# Altium footprint library PcbLib.PcbLib: 108 footprints (part 2 of 7)
Each footprint in its own frame and in the unit in brackets; x right, y up, seen from the top. Pads: shape width x height; smd on the part's side, far side on the other; paste and mask are expansions set on the pad; w line width, h text height; cw(c..) or ccw(c..) is an arc to the next point about the centre after c.
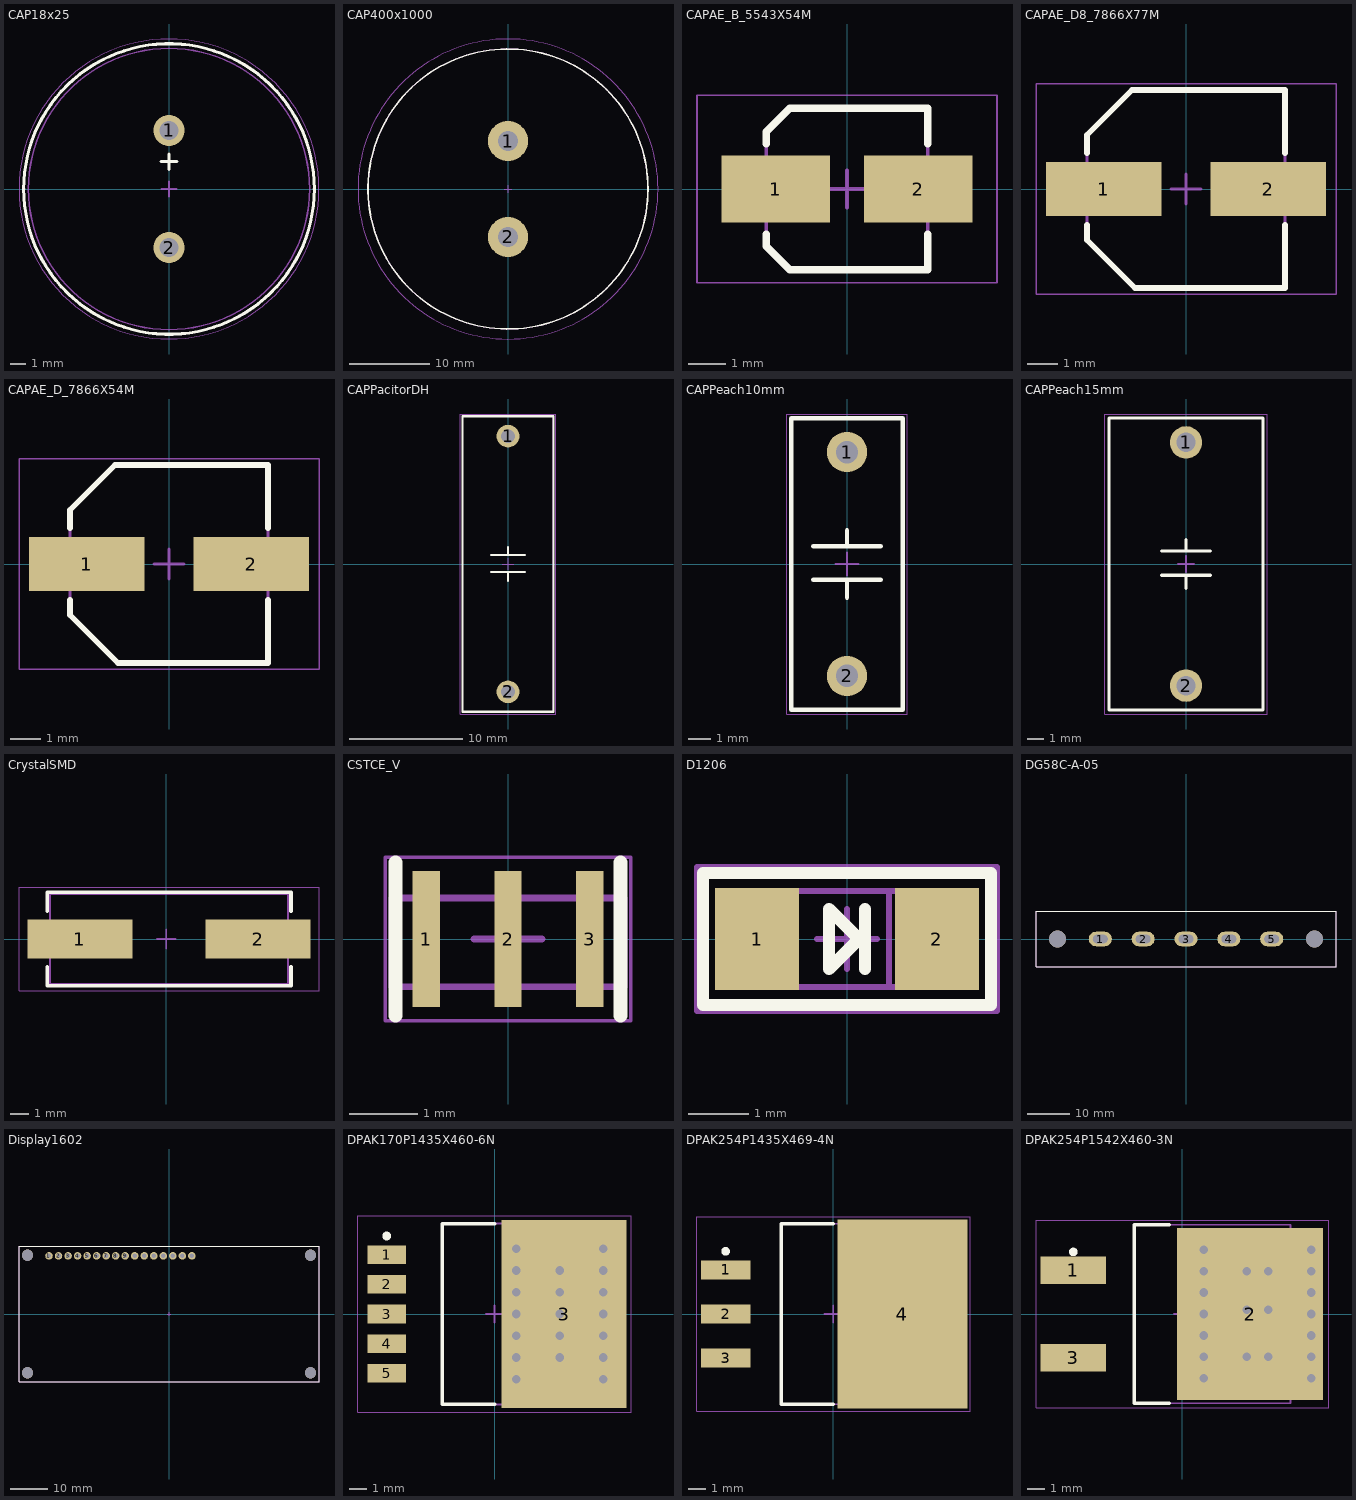
[diagram p1: the footprints below, top view; thin cyan lines are the x and y axes]

## CAP18x25 [mm]
height 25
pads (2):
  round 2 hole 1.2: 1(0,3.75) 2(0,-3.75)
Top Overlay:
  circle w0.2: c0,0 r9.3
  lines w0.2: -0.5,1.75 0.5,1.75 ; 0,1.25 0,2.25
Mechanical 13:
  circle w0.05: c0,0 r9.6
  lines w0.1: -0.5,0 0.5,0 ; 0,-0.5 0,0.5
Mechanical 14:
  circle w0.1: c0,0 r9
3D body "Capacitor18X25mm.step": height 25.55, standoff -3.1, extent -10.302,-10.346 10.295,10.297

## CAP400x1000 [mm]
height 60
pads (2):
  round 5 hole 2.5: 1(0,6) 2(0,-6)
Top Overlay:
  circle w0.2: c0,0 r17.5
Mechanical 13:
  circle w0.05: c0,0 r18.752
  lines w0.1: -0.5,0 0.5,0 ; 0,-0.5 0,0.5
Mechanical 14:
  circle w0.1: c0,0 r17.502
3D body "CAP400V1000uf.STEP": height 60, standoff -5.3, extent -24.549,-24.553 24.537,24.537

## CAPAE_B_5543X54M [mm] "Aluminum Electrolytic Capacitor, Body 4,30x4,30x5,40mm, IPC Low Density"
height 5.4
pads (2):
  rect 2.9x1.8 smd: 1(-1.9,0) 2(1.9,0)
Top Overlay:
  lines w0.2: -2.15,-1.2 -2.15,-1.525 -1.525,-2.15 2.15,-2.15 2.15,-1.2 ; -2.15,1.2 -2.15,1.525 -1.525,2.15 2.15,2.15 2.15,1.2
Mechanical 13:
  lines w0.05: -4,-2.5 -4,2.5 4,2.5 4,-2.5 -4,-2.5
  lines w0.1: -0.5,0 0.5,0 ; 0,-0.5 0,0.5
Mechanical 14:
  lines w0.1: -2.15,-1.525 -1.525,-2.15 2.15,-2.15 2.15,2.15 -1.525,2.15 -2.15,1.525 -2.15,-1.525
3D body "User Library-ALU-B.STEP": height 5.4, standoff 0, extent -2.3,-2.25 2.3,2.05

## CAPAE_D8_7866X77M [mm] "Aluminum Electrolytic Capacitor, Body 6,60x6,60x7.70mm, IPC Low Density"
height 7.7
pads (2):
  rect 3.85x1.8 smd: 1(-2.75,0) 2(2.75,0)
Top Overlay:
  lines w0.2: -3.3,-1.2 -3.3,-1.7 -1.7,-3.3 3.3,-3.3 3.3,-1.2 ; -3.3,1.2 -3.3,1.8 -1.8,3.3 3.3,3.3 3.3,1.2
Mechanical 13:
  lines w0.05: -5,-3.5 5,-3.5 5,3.5 -5,3.5 -5,-3.5
  lines w0.1: -0.5,0 0.5,0 ; 0,-0.5 0,0.5
Mechanical 14:
  lines w0.1: -3.3,-1.7 -3.3,1.8 -1.8,3.3 3.3,3.3 3.3,-3.3 -1.7,-3.3 -3.3,-1.7
3D body "User Library-ALU-D8.STEP": height 7.7, standoff 0, extent -3.5,-3.3 3.5,3.3

## CAPAE_D_7866X54M [mm] "Aluminum Electrolytic Capacitor, Body 6,60x6,60x5,40mm, IPC Low Density"
height 5.4
pads (2):
  rect 3.85x1.8 smd: 1(-2.75,0) 2(2.75,0)
Top Overlay:
  lines w0.2: -3.3,-1.2 -3.3,-1.7 -1.7,-3.3 3.3,-3.3 3.3,-1.2 ; -3.3,1.2 -3.3,1.8 -1.8,3.3 3.3,3.3 3.3,1.2
Mechanical 13:
  lines w0.05: -5,-3.5 -5,3.5 5,3.5 5,-3.5 -5,-3.5
  lines w0.1: -0.5,0 0.5,0 ; 0,-0.5 0,0.5
Mechanical 14:
  lines w0.1: -3.3,-1.7 -1.7,-3.3 3.3,-3.3 3.3,3.3 -1.8,3.3 -3.3,1.8 -3.3,-1.7
3D body "User Library-ALU-D.STEP": height 5.4, standoff 0, extent -3.5,-3.3 3.5,3.3

## CAPPacitorDH [mm] "Peach 22.5mm"
height 16
pads (2):
  round 2 hole 1.2: 1(0,11.25) 2(0,-11.25)
Top Overlay:
  lines w0.2: -1.5,-0.7 1.5,-0.7 ; -1.5,0.8 1.5,0.8 ; 0,-1.5 0,-0.7 ; 0,0.8 0,1.5 ; -4,-13 4,-13 4,13 -4,13 -4,3.5 -4,-13
Mechanical 13:
  lines w0.05: -4.2,-13.2 -4.2,13.2 4.2,13.2 4.2,-13.2 -4.2,-13.2
  lines w0.1: -0.5,0 0.5,0 ; 0,-0.5 0,0.5
Mechanical 14:
  lines w0.1: -4,-13 4,-13 4,13 -4,13 -4,-13
3D body "F844DH104M440C.step": height 16.1, standoff -4.9, extent -4.003,-13 4.003,13

## CAPPeach10mm [mm]
height 11
pads (2):
  round 1.8 hole 1: 1(0,5) 2(0,-5)
Top Overlay:
  lines w0.2: -1.5,-0.7 1.5,-0.7 ; -1.5,0.8 1.5,0.8 ; 0,-1.5 0,-0.7 ; 0,0.8 0,1.5 ; -2.5,-6.5 2.5,-6.5 2.5,6.5 -2.5,6.5 -2.5,5 -2.5,-6.5
Mechanical 13:
  lines w0.05: -2.7,-6.7 -2.7,6.7 2.7,6.7 2.7,-6.7 -2.7,-6.7
  lines w0.1: -0.5,0 0.5,0 ; 0,-0.5 0,0.5
Mechanical 14:
  lines w0.1: -2.5,-6.5 2.5,-6.5 2.5,6.5 -2.5,6.5 -2.5,-6.5
3D body "User Library-Hua Jung MKP-104K0305AB1101-P.step": height 12, standoff -2.81, extent -2.501,-6.5 2.5,6.5

## CAPPeach15mm [mm] "18x10x16"
height 16
pads (2):
  round 2 hole 1.2: 1(0,7.5) 2(0,-7.5)
Top Overlay:
  lines w0.2: -1.5,-0.7 1.5,-0.7 ; -1.5,0.8 1.5,0.8 ; 0,-1.5 0,-0.7 ; 0,0.8 0,1.5 ; -4.75,-9 -4.75,2.75 -4.75,9 4.75,9 4.75,-9 -4.75,-9
Mechanical 13:
  lines w0.05: -5,-9.25 5,-9.25 5,9.25 -5,9.25 -5,-9.25
  lines w0.1: -0.5,0 0.5,0 ; 0,-0.5 0,0.5
Mechanical 14:
  lines w0.1: -4.75,-9 -4.75,9 4.75,9 4.75,-9 -4.75,-9
3D body "F426BV105J250C_18x10x16.step": height 17.55, standoff -5.95, extent -4.755,-9 4.75,9

## CrystalSMD [mm] "HC/49US (AT49) SMD LOW PROFILE CRYSTAL"
height 4.2
pads (2):
  rect 5.6x2.1 smd: 1(-4.6,0) 2(4.9,0)
Top Overlay:
  lines w0.2: -6.35,-1.5 -6.35,-2.5 6.65,-2.5 6.65,-1.5 ; -6.35,1.5 -6.35,2.5 6.65,2.5 6.65,1.5
Mechanical 13:
  lines w0.05: -7.85,-2.75 -7.85,2.75 8.15,2.75 8.15,-2.75 -7.85,-2.75
  lines w0.1: -0.5,0 0.5,0 ; 0,-0.5 0,0.5
Mechanical 14:
  lines w0.1: -6.2,-2.4 -6.2,2.4 6.5,2.4 6.5,-2.4 -6.2,-2.4
3D body "User Library-Crystal HC49_US-SM.step": height 4.4, standoff 0.1, extent -6.25,-2.415 6.55,2.415

## CSTCE_V [mm]
height 1
pads (3):
  rect 0.4x2 smd: 1(-1.2,0) 2(0,0) 3(1.2,0)
Top Overlay:
  lines w0.2: -1.65,-1.125 -1.65,1.125 ; 1.65,-1.125 1.65,1.125
Mechanical 13:
  lines w0.05: -1.8,-1.2 1.8,-1.2 1.8,1.2 -1.8,1.2 -1.8,-1.2
  lines w0.1: -0.5,0 0.5,0 ; 0,-0.5 0,0.5
Mechanical 14:
  lines w0.1: -1.7,-0.7 1.7,-0.7 1.7,0.6 -1.7,0.6 -1.7,-0.7
3D body "SW3dPS-CSTCE_V-1.STEP": height 1.02, standoff -0.09, extent -1.6,-0.675 1.6,0.625

## D1206 [mm]
height 0.6
pads (2):
  rect 1.4x1.7 smd: 1(-1.5,0) 2(1.5,0)
Top Overlay:
  lines w0.2: 0.3,-0.5 0.3,0.5 ; -2.4,-1.1 2.4,-1.1 2.4,1.1 -2.4,1.1 -2.4,-1.1 ; -0.3,-0.5 0.2,0 -0.3,0.5 -0.3,-0.5
Mechanical 13:
  lines w0.1: -0.5,0 0.5,0 ; 0,-0.5 0,0.5 ; -2.5,-1.2 -2.5,1.2 2.5,1.2 2.5,-1.2 -2.5,-1.2
Mechanical 14:
  lines w0.1: 0.7,-0.8 0.7,0.8 ; 1,-0.8 1,0.8 ; -1.6,-0.8 1.6,-0.8 1.6,0.8 -1.6,0.8 -1.6,-0.8
3D body "User Library-D1206.step": height 0.85, standoff 0, extent -1.675,-0.865 1.675,0.865

## DG58C-A-05 [mm] "Connector 10mm pitch"
height 17
pads (5):
  oval 5.4x3.4 hole 2 slot 3.4 at 0 deg: 1(-20,0) 2(-10,0) 3(0,0) 4(10,0) 5(20,0)
via -30,0 diameter 4 hole 4
via 30,0 diameter 4 hole 4
Top Overlay:
  lines w0.2: -35,-6.5 35,-6.5 35,6.5 -35,6.5 -35,-6.5
Mechanical 13:
  lines w0.05: -35,-6.5 35,-6.5 35,6.5 -35,6.5 -35,-6.5
  lines w0.1: -0.5,0 0.5,0 ; 0,-0.5 0,0.5
Mechanical 14:
  lines w0.1: -35,-6.5 -35,6.5 35,6.5 35,-6.5 -35,-6.5
3D body "DG58-A-5.STEP": height 17.4, standoff -3.9, extent -35,-6.4 35,6.4

## Display1602 [mm]
height 15
pads (16):
  round 2 hole 1.2: 1(-32,15.5) 2(-29.46,15.5) 3(-26.92,15.5) 4(-24.38,15.5) 5(-21.84,15.5) 6(-19.3,15.5) 7(-16.76,15.5) 8(-14.22,15.5) 9(-11.68,15.5) 10(-9.14,15.5) 11(-6.6,15.5) 12(-4.06,15.5) 13(-1.52,15.5) 14(1.02,15.5) 15(3.56,15.5) 16(6.1,15.5)
via 37.7,-15.7 diameter 3 hole 3
via -37.7,-15.7 diameter 3 hole 3
via -37.7,15.7 diameter 3 hole 3
via 37.7,15.7 diameter 3 hole 3
Top Overlay:
  lines w0.2: -40,-18 40,-18 40,18 1,18 -40,18 -40,-18
Mechanical 13:
  lines w0.1: -0.5,0 0.5,0 ; 0,-0.5 0,0.5
Mechanical 14:
  lines w0.1: -40,-18 -40,18 40,18 40,-18 -40,-18
3D body "LCD 16x2 WC1602A0-SFYLNC06.step": height 18.4, standoff 5.5, extent -40.1,-18.025 40.15,17.975

## DPAK170P1435X460-6N [mm] "D2-PAK, 6-Pads, Body 7,55x8,56mm (max), IPC Medium Density"
height 4.6
pads (6):
  rect 2.2x1.07 smd: 1(-6.2,3.4) 2(-6.2,1.7) 3(-6.2,0) 4(-6.2,-1.7) 5(-6.2,-3.4)
  rect 7.2x10.8 smd: 3(4,0)
via 6.25,3.75 diameter 1 hole 0.5
via 6.25,2.5 diameter 1 hole 0.5
via 6.25,1.25 diameter 1 hole 0.5
via 6.25,0 diameter 1 hole 0.5
via 6.25,-1.25 diameter 1 hole 0.5
via 6.25,-2.5 diameter 1 hole 0.5
via 6.25,-3.75 diameter 1 hole 0.5
via 3.75,2.5 diameter 1 hole 0.5
via 3.75,1.25 diameter 1 hole 0.5
via 3.75,0 diameter 1 hole 0.5
via 3.75,-1.25 diameter 1 hole 0.5
via 3.75,-2.5 diameter 1 hole 0.5
via 1.25,-3.75 diameter 1 hole 0.5
via 1.25,-2.5 diameter 1 hole 0.5
via 1.25,-1.25 diameter 1 hole 0.5
via 1.25,0 diameter 1 hole 0.5
via 1.25,1.25 diameter 1 hole 0.5
via 1.25,2.5 diameter 1 hole 0.5
via 1.25,3.75 diameter 1 hole 0.5
Top Overlay:
  circle w0.25: c-6.2,4.485 r0.125
  lines w0.2: 0,-5.2 -3,-5.2 -3,5.2 0,5.2
Mechanical 13:
  lines w0.05: -7.85,-5.65 7.85,-5.65 7.85,5.65 -7.85,5.65 -7.85,-5.65
  lines w0.1: -0.5,0 0.5,0 ; 0,-0.5 0,0.5
Mechanical 14:
  lines w0.1: -3,-5.2 5.89,-5.2 5.89,5.2 -3,5.2 -3,-5.2
3D body "User Library-D2PAK TO-263-5.step": height 4.87, standoff 0, extent -6.94,-5.08 7.29,5.08

## DPAK254P1435X469-4N [mm] "D2-PAK, 4-Pads, Body 7,55x8,56mm (max), IPC Medium Density(LM1085)"
height 4.69
pads (4):
  rect 2.85x1.1 smd: 1(-6.2,2.54) 2(-6.2,0) 3(-6.2,-2.54)
  rect 7.5x10.9 smd: 4(4,0)
Top Overlay:
  circle w0.25: c-6.2,3.615 r0.125
  lines w0.2: 0,-5.2 -3,-5.2 -3,5.2 0,5.2
Mechanical 13:
  lines w0.05: -7.85,-5.6 -7.85,5.6 7.9,5.6 7.9,-5.6 -7.85,-5.6
  lines w0.1: -0.5,0 0.5,0 ; 0,-0.5 0,0.5
Mechanical 14:
  lines w0.1: -3,-5.2 -3,5.2 5.89,5.2 5.89,-5.2 -3,-5.2
3D body "User Library-D2PAK TO-263-3.step": height 4.87, standoff 0, extent -7.14,-5.08 7.09,5.08

## DPAK254P1542X460-3N [mm] "D2-PAK, 3-Pads, Body 7,65x8,56mm (max), IPC Medium Density"
height 4.6
pads (3):
  rect 3.8x1.6 smd: 1(-6.35,2.54) 3(-6.35,-2.54)
  rect 8.5x10 smd: 2(3.95,0)
via 7.5,3.75 diameter 1 hole 0.5
via 7.5,2.5 diameter 1 hole 0.5
via 7.5,1.25 diameter 1 hole 0.5
via 7.5,0 diameter 1 hole 0.5
via 7.5,-1.25 diameter 1 hole 0.5
via 7.5,-2.5 diameter 1 hole 0.5
via 7.5,-3.75 diameter 1 hole 0.5
via 3.75,0.25 diameter 1 hole 0.5
via 5,0.25 diameter 1 hole 0.5
via 5,2.5 diameter 1 hole 0.5
via 3.75,2.5 diameter 1 hole 0.5
via 5,-2.5 diameter 1 hole 0.5
via 3.75,-2.5 diameter 1 hole 0.5
via 1.25,2.5 diameter 1 hole 0.5
via 1.25,1.25 diameter 1 hole 0.5
via 1.25,0 diameter 1 hole 0.5
via 1.25,-1.25 diameter 1 hole 0.5
via 1.25,-2.5 diameter 1 hole 0.5
via 1.25,-3.75 diameter 1 hole 0.5
via 1.25,3.75 diameter 1 hole 0.5
Top Overlay:
  circle w0.25: c-6.35,3.615 r0.125
  lines w0.2: -0.75,-5.2 -2.8,-5.2 -2.8,5.2 -0.75,5.2
Mechanical 13:
  lines w0.05: -8.525,-5.45 8.525,-5.45 8.525,5.45 -8.525,5.45 -8.525,-5.45
  lines w0.1: -0.5,0 0.5,0 ; 0,-0.5 0,0.5
Mechanical 14:
  lines w0.1: -2.8,-5.2 6.3,-5.2 6.3,5.2 -2.8,5.2 -2.8,-5.2
3D body "User Library-DPAK.step": height 4.98, standoff -0.03, extent -7.416,-5.08 7.848,5.08